# Altium footprint library WR-TBL_Spring Clamp.PcbLib: 258 footprints (part 5 of 17)
Each footprint in its own frame and in the unit in brackets; x right, y up, seen from the top. Pads: shape width x height; smd on the part's side, far side on the other; paste and mask are expansions set on the pad; w line width, h text height; cw(c..) or ccw(c..) is an arc to the next point about the centre after c.
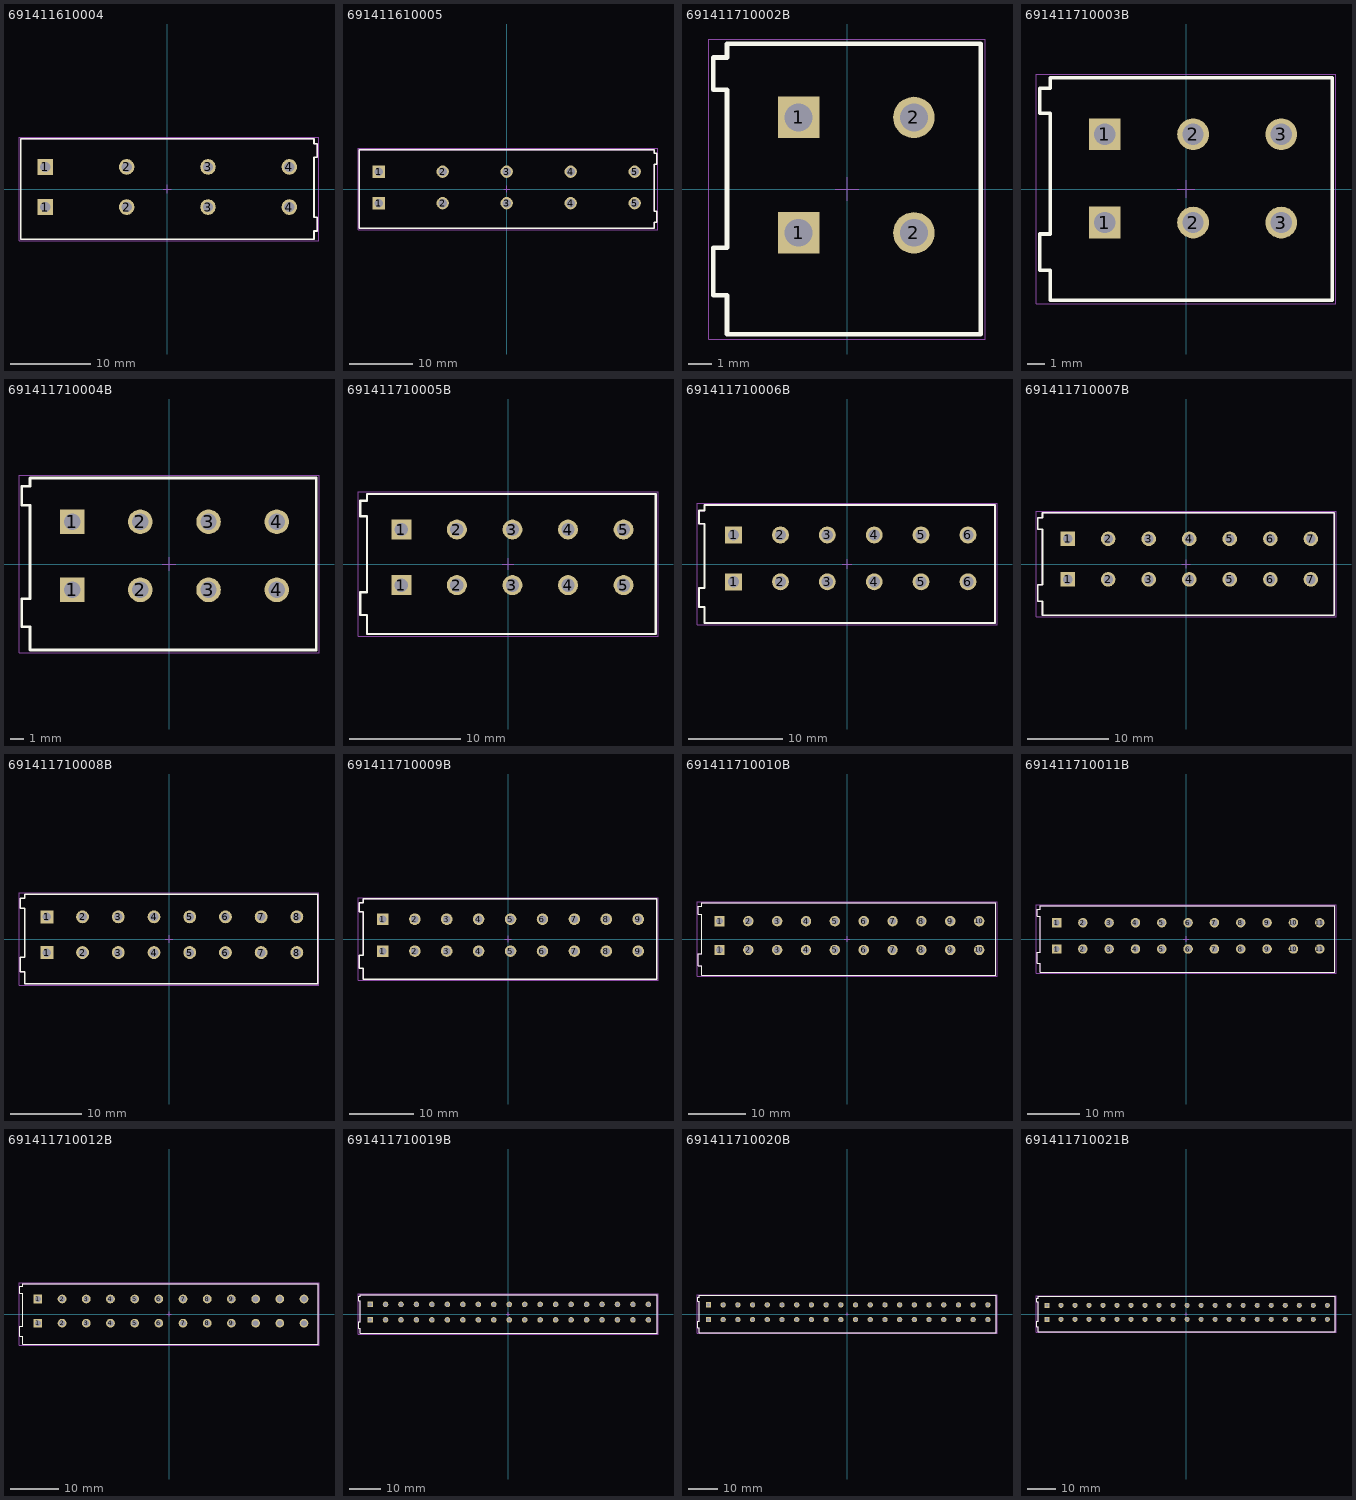
[diagram p4: the footprints below, top view; thin cyan lines are the x and y axes]

## 691411610004 [mm] "10.16mm Horizontal Cable Entry Screwless, 04p"
height 13.9
pads (8):
  rect 1.95x1.95 hole 1.3: 1(-15.24,-2.25) 1(-15.24,2.75)
  round 1.95 hole 1.3: 2(-5.08,-2.25) 2(-5.08,2.75) 3(5.08,-2.25) 3(5.08,2.75) 4(15.24,-2.25) 4(15.24,2.75)
Top Overlay:
  lines w0.2: -18.32,-6.25 -18.32,6.25 18.32,6.25 18.32,5.65 18.74,5.65 18.74,3.95 18.32,3.95 18.32,-3.55 18.74,-3.55 18.74,-5.25 18.32,-5.25 18.32,-6.25 -18.32,-6.25
Mechanical 13:
  lines w0.1: -18.32,-6.25 18.32,-6.25 18.32,-5.25 18.74,-5.25 18.74,-3.55 18.32,-3.55 18.32,3.95 18.74,3.95 18.74,5.65 18.32,5.65 18.32,6.25 -18.32,6.25 -18.32,-6.25
Mechanical 15:
  lines w0.05: -0.5,0 0.5,0 ; 0,-0.5 0,0.5 ; -18.52,-6.45 18.94,-6.45 18.94,6.45 -18.52,6.45 -18.52,-6.45
3D body "691411610004.stp": height 14, standoff -3.5, extent -18.32,-6.25 18.576,6.25

## 691411610005 [mm] "10.16mm Horizontal Cable Entry Screwless, 05p"
height 13.9
pads (10):
  rect 1.95x1.95 hole 1.3: 1(-20.32,-2.25) 1(-20.32,2.75)
  round 1.95 hole 1.3: 2(-10.16,-2.25) 2(-10.16,2.75) 3(0,-2.25) 3(0,2.75) 4(10.16,-2.25) 4(10.16,2.75) 5(20.32,-2.25) 5(20.32,2.75)
Top Overlay:
  lines w0.2: -23.4,-6.25 23.4,-6.25 23.4,-5.25 23.82,-5.25 23.82,-3.55 23.4,-3.55 23.4,3.95 23.82,3.95 23.82,5.65 23.4,5.65 23.4,6.25 -23.4,6.25 -23.4,-6.25
Mechanical 13:
  lines w0.1: -23.4,-6.25 -23.4,6.25 23.4,6.25 23.4,5.65 23.82,5.65 23.82,3.95 23.4,3.95 23.4,-3.55 23.82,-3.55 23.82,-5.25 23.4,-5.25 23.4,-6.25 -23.4,-6.25
Mechanical 15:
  lines w0.05: -0.5,0 0.5,0 ; 0,-0.5 0,0.5 ; -23.6,-6.45 -23.6,6.45 24.02,6.45 24.02,-6.45 -23.6,-6.45
3D body "691411610005 (rev1).stp": height 14, standoff -3.5, extent -23.4,-6.25 23.575,6.25

## 691411710002B [mm] "5.00 mm Screwless Horizontal Entry - 2.0 mm2 Wires, 2p"
height 15.25
pads (4):
  rect 1.8x1.8 hole 1.2: 1(-2.1,-1.9) 1(-2.1,3.1)
  round 1.8 hole 1.2: 2(2.9,-1.9) 2(2.9,3.1)
Top Overlay:
  lines w0.2: -5.8,-4.6 -5.8,-2.55 -5.2,-2.55 -5.2,4.3 -5.8,4.3 -5.8,5.7 -5.2,5.7 -5.2,6.3 5.8,6.3 5.8,-6.3 -5.2,-6.3 -5.2,-4.6 -5.8,-4.6
Mechanical 13:
  lines w0.1: -5.8,-4.6 -5.2,-4.6 -5.2,-6.3 5.8,-6.3 5.8,6.3 -5.2,6.3 -5.2,5.7 -5.8,5.7 -5.8,4.3 -5.2,4.3 -5.2,-2.55 -5.8,-2.55 -5.8,-4.6
Mechanical 15:
  lines w0.05: -0.5,0 0.5,0 ; 0,-0.5 0,0.5 ; -6,-6.5 -6,6.5 6,6.5 6,-6.5 -6,-6.5
3D body "691411710002B.stp": height 15.65, standoff -3.55, extent -5.8,-6.3 5.8,6.3

## 691411710003B [mm] "5.00 mm Screwless Horizontal Entry - 2.0 mm2 Wires, 3p"
height 15.25
pads (6):
  rect 1.8x1.8 hole 1.2: 1(-4.6,-1.9) 1(-4.6,3.1)
  round 1.8 hole 1.2: 2(0.4,-1.9) 2(0.4,3.1) 3(5.4,-1.9) 3(5.4,3.1)
Top Overlay:
  lines w0.2: -8.3,-4.6 -7.7,-4.6 -7.7,-6.3 8.3,-6.3 8.3,6.3 -7.7,6.3 -7.7,5.7 -8.3,5.7 -8.3,4.3 -7.7,4.3 -7.7,-2.55 -8.3,-2.55 -8.3,-4.6
Mechanical 13:
  lines w0.1: -8.3,-4.6 -8.3,-2.55 -7.7,-2.55 -7.7,4.3 -8.3,4.3 -8.3,5.7 -7.7,5.7 -7.7,6.3 8.3,6.3 8.3,-6.3 -7.7,-6.3 -7.7,-4.6 -8.3,-4.6
Mechanical 15:
  lines w0.05: -0.5,0 0.5,0 ; 0,-0.5 0,0.5 ; -8.5,-6.5 8.5,-6.5 8.5,6.5 -8.5,6.5 -8.5,-6.5
3D body "691411710003B.stp": height 15.65, standoff -3.55, extent -8.3,-6.3 8.3,6.3

## 691411710004B [mm] "5.00 mm Screwless Horizontal Entry - 2.0 mm2 Wires, 4p"
height 15.25
pads (8):
  rect 1.8x1.8 hole 1.2: 1(-7.1,-1.9) 1(-7.1,3.1)
  round 1.8 hole 1.2: 2(-2.1,-1.9) 2(-2.1,3.1) 3(2.9,-1.9) 3(2.9,3.1) 4(7.9,-1.9) 4(7.9,3.1)
Top Overlay:
  lines w0.2: -10.8,-4.6 -10.8,-2.55 -10.2,-2.55 -10.2,4.3 -10.8,4.3 -10.8,5.7 -10.2,5.7 -10.2,6.3 10.8,6.3 10.8,-6.3 -10.2,-6.3 -10.2,-4.6 -10.8,-4.6
Mechanical 13:
  lines w0.1: -10.8,-4.6 -10.2,-4.6 -10.2,-6.3 10.8,-6.3 10.8,6.3 -10.2,6.3 -10.2,5.7 -10.8,5.7 -10.8,4.3 -10.2,4.3 -10.2,-2.55 -10.8,-2.55 -10.8,-4.6
Mechanical 15:
  lines w0.05: -0.5,0 0.5,0 ; 0,-0.5 0,0.5 ; -11,-6.5 -11,6.5 11,6.5 11,-6.5 -11,-6.5
3D body "691411710004B.stp": height 15.65, standoff -3.55, extent -10.8,-6.3 10.8,6.3

## 691411710005B [mm] "5.00 mm Screwless Horizontal Entry - 2.0 mm2 Wires, 5p"
height 15.25
pads (10):
  rect 1.8x1.8 hole 1.2: 1(-9.6,-1.9) 1(-9.6,3.1)
  round 1.8 hole 1.2: 2(-4.6,-1.9) 2(-4.6,3.1) 3(0.4,-1.9) 3(0.4,3.1) 4(5.4,-1.9) 4(5.4,3.1) 5(10.4,-1.9) 5(10.4,3.1)
Top Overlay:
  lines w0.2: -13.3,-4.6 -13.3,-2.55 -12.7,-2.55 -12.7,4.3 -13.3,4.3 -13.3,5.7 -12.7,5.7 -12.7,6.3 13.3,6.3 13.3,-6.3 -12.7,-6.3 -12.7,-4.6 -13.3,-4.6
Mechanical 13:
  lines w0.1: -13.3,-4.6 -12.7,-4.6 -12.7,-6.3 13.3,-6.3 13.3,6.3 -12.7,6.3 -12.7,5.7 -13.3,5.7 -13.3,4.3 -12.7,4.3 -12.7,-2.55 -13.3,-2.55 -13.3,-4.6
Mechanical 15:
  lines w0.05: -0.5,0 0.5,0 ; 0,-0.5 0,0.5 ; -13.5,-6.5 -13.5,6.5 13.5,6.5 13.5,-6.5 -13.5,-6.5
3D body "691411710005B.stp": height 15.65, standoff -3.55, extent -13.3,-6.3 13.3,6.3

## 691411710006B [mm] "5.00 mm Screwless Horizontal Entry - 2.0 mm2 Wires, 6p"
height 15.25
pads (12):
  rect 1.8x1.8 hole 1.2: 1(-12.1,-1.9) 1(-12.1,3.1)
  round 1.8 hole 1.2: 2(-7.1,-1.9) 2(-7.1,3.1) 3(-2.1,-1.9) 3(-2.1,3.1) 4(2.9,-1.9) 4(2.9,3.1) 5(7.9,-1.9) 5(7.9,3.1) 6(12.9,-1.9) 6(12.9,3.1)
Top Overlay:
  lines w0.2: -15.8,-4.6 -15.2,-4.6 -15.2,-6.3 15.8,-6.3 15.8,6.3 -15.2,6.3 -15.2,5.7 -15.8,5.7 -15.8,4.3 -15.2,4.3 -15.2,-2.55 -15.8,-2.55 -15.8,-4.6
Mechanical 13:
  lines w0.1: -15.8,-4.6 -15.8,-2.55 -15.2,-2.55 -15.2,4.3 -15.8,4.3 -15.8,5.7 -15.2,5.7 -15.2,6.3 15.8,6.3 15.8,-6.3 -15.2,-6.3 -15.2,-4.6 -15.8,-4.6
Mechanical 15:
  lines w0.05: -0.5,0 0.5,0 ; 0,-0.5 0,0.5 ; -16,-6.5 16,-6.5 16,6.5 -16,6.5 -16,-6.5
3D body "691411710006B.stp": height 15.65, standoff -3.55, extent -15.8,-6.3 15.8,6.3

## 691411710007B [mm] "5.00 mm Screwless Horizontal Entry - 2.0 mm2 Wires, 7p"
height 15.25
pads (14):
  rect 1.8x1.8 hole 1.2: 1(-14.6,-1.9) 1(-14.6,3.1)
  round 1.8 hole 1.2: 2(-9.6,-1.9) 2(-9.6,3.1) 3(-4.6,-1.9) 3(-4.6,3.1) 4(0.4,-1.9) 4(0.4,3.1) 5(5.4,-1.9) 5(5.4,3.1) 6(10.4,-1.9) 6(10.4,3.1) 7(15.4,-1.9) 7(15.4,3.1)
Top Overlay:
  lines w0.2: -18.3,-4.6 -18.3,-2.55 -17.7,-2.55 -17.7,4.3 -18.3,4.3 -18.3,5.7 -17.7,5.7 -17.7,6.3 18.3,6.3 18.3,-6.3 -17.7,-6.3 -17.7,-4.6 -18.3,-4.6
Mechanical 13:
  lines w0.1: -18.3,-4.6 -17.7,-4.6 -17.7,-6.3 18.3,-6.3 18.3,6.3 -17.7,6.3 -17.7,5.7 -18.3,5.7 -18.3,4.3 -17.7,4.3 -17.7,-2.55 -18.3,-2.55 -18.3,-4.6
Mechanical 15:
  lines w0.05: -0.5,0 0.5,0 ; 0,-0.5 0,0.5 ; -18.5,-6.5 -18.5,6.5 18.5,6.5 18.5,-6.5 -18.5,-6.5
3D body "691411710007B.stp": height 15.65, standoff -3.55, extent -18.3,-6.3 18.3,6.3

## 691411710008B [mm] "5.00 mm Screwless Horizontal Entry - 2.0 mm2 Wires, 8p"
height 15.25
pads (16):
  rect 1.8x1.8 hole 1.2: 1(-17.1,-1.9) 1(-17.1,3.1)
  round 1.8 hole 1.2: 2(-12.1,-1.9) 2(-12.1,3.1) 3(-7.1,-1.9) 3(-7.1,3.1) 4(-2.1,-1.9) 4(-2.1,3.1) 5(2.9,-1.9) 5(2.9,3.1) 6(7.9,-1.9) 6(7.9,3.1) 7(12.9,-1.9) 7(12.9,3.1) 8(17.9,-1.9) 8(17.9,3.1)
Top Overlay:
  lines w0.2: -20.8,-4.6 -20.2,-4.6 -20.2,-6.3 20.8,-6.3 20.8,6.3 -20.2,6.3 -20.2,5.7 -20.8,5.7 -20.8,4.3 -20.2,4.3 -20.2,-2.55 -20.8,-2.55 -20.8,-4.6
Mechanical 13:
  lines w0.1: -20.8,-4.6 -20.8,-2.55 -20.2,-2.55 -20.2,4.3 -20.8,4.3 -20.8,5.7 -20.2,5.7 -20.2,6.3 20.8,6.3 20.8,-6.3 -20.2,-6.3 -20.2,-4.6 -20.8,-4.6
Mechanical 15:
  lines w0.05: -0.5,0 0.5,0 ; 0,-0.5 0,0.5 ; -21,-6.5 21,-6.5 21,6.5 -21,6.5 -21,-6.5
3D body "691411710008B.stp": height 15.65, standoff -3.55, extent -20.8,-6.3 20.8,6.3

## 691411710009B [mm] "5.00 mm Screwless Horizontal Entry - 2.0 mm2 Wires, 9p"
height 15.25
pads (18):
  rect 1.8x1.8 hole 1.2: 1(-19.6,-1.9) 1(-19.6,3.1)
  round 1.8 hole 1.2: 2(-14.6,-1.9) 2(-14.6,3.1) 3(-9.6,-1.9) 3(-9.6,3.1) 4(-4.6,-1.9) 4(-4.6,3.1) 5(0.4,-1.9) 5(0.4,3.1) 6(5.4,-1.9) 6(5.4,3.1) 7(10.4,-1.9) 7(10.4,3.1) 8(15.4,-1.9) 8(15.4,3.1) 9(20.4,-1.9) 9(20.4,3.1)
Top Overlay:
  lines w0.2: -23.3,-4.6 -22.7,-4.6 -22.7,-6.3 23.3,-6.3 23.3,6.3 -22.7,6.3 -22.7,5.7 -23.3,5.7 -23.3,4.3 -22.7,4.3 -22.7,-2.55 -23.3,-2.55 -23.3,-4.6
Mechanical 13:
  lines w0.1: -23.3,-4.6 -23.3,-2.55 -22.7,-2.55 -22.7,4.3 -23.3,4.3 -23.3,5.7 -22.7,5.7 -22.7,6.3 23.3,6.3 23.3,-6.3 -22.7,-6.3 -22.7,-4.6 -23.3,-4.6
Mechanical 15:
  lines w0.05: -0.5,0 0.5,0 ; 0,-0.5 0,0.5 ; -23.5,-6.5 23.5,-6.5 23.5,6.5 -23.5,6.5 -23.5,-6.5
3D body "691411710009B.stp": height 15.65, standoff -3.55, extent -23.3,-6.3 23.3,6.3

## 691411710010B [mm] "5.00 mm Screwless Horizontal Entry - 2.0 mm2 Wires, 10p"
height 15.25
pads (20):
  rect 1.8x1.8 hole 1.2: 1(-22.1,-1.9) 1(-22.1,3.1)
  round 1.8 hole 1.2: 2(-17.1,-1.9) 2(-17.1,3.1) 3(-12.1,-1.9) 3(-12.1,3.1) 4(-7.1,-1.9) 4(-7.1,3.1) 5(-2.1,-1.9) 5(-2.1,3.1) 6(2.9,-1.9) 6(2.9,3.1) 7(7.9,-1.9) 7(7.9,3.1) 8(12.9,-1.9) 8(12.9,3.1) 9(17.9,-1.9) 9(17.9,3.1) 10(22.9,-1.9) 10(22.9,3.1)
Top Overlay:
  lines w0.2: -25.8,-4.6 -25.8,-2.55 -25.2,-2.55 -25.2,4.3 -25.8,4.3 -25.8,5.7 -25.2,5.7 -25.2,6.3 25.8,6.3 25.8,-6.3 -25.2,-6.3 -25.2,-4.6 -25.8,-4.6
Mechanical 13:
  lines w0.1: -25.8,-4.6 -25.2,-4.6 -25.2,-6.3 25.8,-6.3 25.8,6.3 -25.2,6.3 -25.2,5.7 -25.8,5.7 -25.8,4.3 -25.2,4.3 -25.2,-2.55 -25.8,-2.55 -25.8,-4.6
Mechanical 15:
  lines w0.05: -0.5,0 0.5,0 ; 0,-0.5 0,0.5 ; -26,-6.5 -26,6.5 26,6.5 26,-6.5 -26,-6.5
3D body "691411710010B.stp": height 15.65, standoff -3.55, extent -25.8,-6.3 25.8,6.3

## 691411710011B [mm] "5.00 mm Screwless Horizontal Entry - 2.0 mm2 Wires, 11p"
height 15.25
pads (22):
  rect 1.8x1.8 hole 1.2: 1(-24.6,-1.9) 1(-24.6,3.1)
  round 1.8 hole 1.2: 2(-19.6,-1.9) 2(-19.6,3.1) 3(-14.6,-1.9) 3(-14.6,3.1) 4(-9.6,-1.9) 4(-9.6,3.1) 5(-4.6,-1.9) 5(-4.6,3.1) 6(0.4,-1.9) 6(0.4,3.1) 7(5.4,-1.9) 7(5.4,3.1) 8(10.4,-1.9) 8(10.4,3.1) 9(15.4,-1.9) 9(15.4,3.1) 10(20.4,-1.9) 10(20.4,3.1) 11(25.4,-1.9) 11(25.4,3.1)
Top Overlay:
  lines w0.2: -28.3,-4.6 -27.7,-4.6 -27.7,-6.3 28.3,-6.3 28.3,6.3 -27.7,6.3 -27.7,5.7 -28.3,5.7 -28.3,4.3 -27.7,4.3 -27.7,-2.55 -28.3,-2.55 -28.3,-4.6
Mechanical 13:
  lines w0.1: -28.3,-4.6 -28.3,-2.55 -27.7,-2.55 -27.7,4.3 -28.3,4.3 -28.3,5.7 -27.7,5.7 -27.7,6.3 28.3,6.3 28.3,-6.3 -27.7,-6.3 -27.7,-4.6 -28.3,-4.6
Mechanical 15:
  lines w0.05: -0.5,0 0.5,0 ; 0,-0.5 0,0.5 ; -28.5,-6.5 28.5,-6.5 28.5,6.5 -28.5,6.5 -28.5,-6.5
3D body "691411710011B.stp": height 15.65, standoff -3.55, extent -28.3,-6.3 28.3,6.3

## 691411710012B [mm] "5.00 mm Screwless Horizontal Entry - 2.0 mm2 Wires, 12p"
height 15.25
pads (24):
  rect 1.8x1.8 hole 1.2: 1(-27.1,-1.9) 1(-27.1,3.1)
  round 1.8 hole 1.2: 2(-22.1,-1.9) 2(-22.1,3.1) 3(-17.1,-1.9) 3(-17.1,3.1) 4(-12.1,-1.9) 4(-12.1,3.1) 5(-7.1,-1.9) 5(-7.1,3.1) 6(-2.1,-1.9) 6(-2.1,3.1) 7(2.9,-1.9) 7(2.9,3.1) 8(7.9,-1.9) 8(7.9,3.1) 9(12.9,-1.9) 9(12.9,3.1) 10(17.9,-1.9) 10(17.9,3.1) 11(22.9,-1.9) 11(22.9,3.1) 12(27.9,-1.9) 12(27.9,3.1)
Top Overlay:
  lines w0.2: -30.8,-4.6 -30.8,-2.55 -30.2,-2.55 -30.2,4.3 -30.8,4.3 -30.8,5.7 -30.2,5.7 -30.2,6.3 30.8,6.3 30.8,-6.3 -30.2,-6.3 -30.2,-4.6 -30.8,-4.6
Mechanical 13:
  lines w0.1: -30.8,-4.6 -30.2,-4.6 -30.2,-6.3 30.8,-6.3 30.8,6.3 -30.2,6.3 -30.2,5.7 -30.8,5.7 -30.8,4.3 -30.2,4.3 -30.2,-2.55 -30.8,-2.55 -30.8,-4.6
Mechanical 15:
  lines w0.05: -0.5,0 0.5,0 ; 0,-0.5 0,0.5 ; -31,-6.5 -31,6.5 31,6.5 31,-6.5 -31,-6.5
3D body "691411710012B.stp": height 15.65, standoff -3.55, extent -30.8,-6.3 30.8,6.3

## 691411710019B [mm] "5.00 mm Screwless Horizontal Entry - 2.0 mm2 Wires, 19p"
height 15.25
pads (38):
  rect 1.8x1.8 hole 1.2: 1(-44.6,-1.9) 1(-44.6,3.1)
  round 1.8 hole 1.2: 2(-39.6,-1.9) 2(-39.6,3.1) 3(-34.6,-1.9) 3(-34.6,3.1) 4(-29.6,-1.9) 4(-29.6,3.1) 5(-24.6,-1.9) 5(-24.6,3.1) 6(-19.6,-1.9) 6(-19.6,3.1) 7(-14.6,-1.9) 7(-14.6,3.1) 8(-9.6,-1.9) 8(-9.6,3.1) 9(-4.6,-1.9) 9(-4.6,3.1) 10(0.4,-1.9) 10(0.4,3.1) 11(5.4,-1.9) 11(5.4,3.1) 12(10.4,-1.9) 12(10.4,3.1) 13(15.4,-1.9) 13(15.4,3.1) 14(20.4,-1.9) 14(20.4,3.1) 15(25.4,-1.9) 15(25.4,3.1) 16(30.4,-1.9) 16(30.4,3.1) 17(35.4,-1.9) 17(35.4,3.1) 18(40.4,-1.9) 18(40.4,3.1) 19(45.4,-1.9) 19(45.4,3.1)
Top Overlay:
  lines w0.2: -48.3,-4.6 -47.7,-4.6 -47.7,-6.3 48.3,-6.3 48.3,6.3 -47.7,6.3 -47.7,5.7 -48.3,5.7 -48.3,4.3 -47.7,4.3 -47.7,-2.55 -48.3,-2.55 -48.3,-4.6
Mechanical 13:
  lines w0.1: -48.3,-4.6 -48.3,-2.55 -47.7,-2.55 -47.7,4.3 -48.3,4.3 -48.3,5.7 -47.7,5.7 -47.7,6.3 48.3,6.3 48.3,-6.3 -47.7,-6.3 -47.7,-4.6 -48.3,-4.6
Mechanical 15:
  lines w0.05: -0.5,0 0.5,0 ; 0,-0.5 0,0.5 ; -48.5,-6.5 48.5,-6.5 48.5,6.5 -48.5,6.5 -48.5,-6.5
3D body "691411710019B.stp": height 15.65, standoff -3.55, extent -48.3,-6.3 48.3,6.3

## 691411710020B [mm] "5.00 mm Screwless Horizontal Entry - 2.0 mm2 Wires, 20p"
height 15.25
pads (40):
  rect 1.8x1.8 hole 1.2: 1(-47.1,-1.9) 1(-47.1,3.1)
  round 1.8 hole 1.2: 2(-42.1,-1.9) 2(-42.1,3.1) 3(-37.1,-1.9) 3(-37.1,3.1) 4(-32.1,-1.9) 4(-32.1,3.1) 5(-27.1,-1.9) 5(-27.1,3.1) 6(-22.1,-1.9) 6(-22.1,3.1) 7(-17.1,-1.9) 7(-17.1,3.1) 8(-12.1,-1.9) 8(-12.1,3.1) 9(-7.1,-1.9) 9(-7.1,3.1) 10(-2.1,-1.9) 10(-2.1,3.1) 11(2.9,-1.9) 11(2.9,3.1) 12(7.9,-1.9) 12(7.9,3.1) 13(12.9,-1.9) 13(12.9,3.1) 14(17.9,-1.9) 14(17.9,3.1) 15(22.9,-1.9) 15(22.9,3.1) 16(27.9,-1.9) 16(27.9,3.1) 17(32.9,-1.9) 17(32.9,3.1) 18(37.9,-1.9) 18(37.9,3.1) 19(42.9,-1.9) 19(42.9,3.1) 20(47.9,-1.9) 20(47.9,3.1)
Top Overlay:
  lines w0.2: -50.8,-4.6 -50.8,-2.55 -50.2,-2.55 -50.2,4.3 -50.8,4.3 -50.8,5.7 -50.2,5.7 -50.2,6.3 50.8,6.3 50.8,-6.3 -50.2,-6.3 -50.2,-4.6 -50.8,-4.6
Mechanical 13:
  lines w0.1: -50.8,-4.6 -50.2,-4.6 -50.2,-6.3 50.8,-6.3 50.8,6.3 -50.2,6.3 -50.2,5.7 -50.8,5.7 -50.8,4.3 -50.2,4.3 -50.2,-2.55 -50.8,-2.55 -50.8,-4.6
Mechanical 15:
  lines w0.05: -0.5,0 0.5,0 ; 0,-0.5 0,0.5 ; -51,-6.5 -51,6.5 51,6.5 51,-6.5 -51,-6.5
3D body "691411710020B.stp": height 15.65, standoff -3.55, extent -50.8,-6.3 50.8,6.3

## 691411710021B [mm] "5.00 mm Screwless Horizontal Entry - 2.0 mm2 Wires, 21p"
height 15.25
pads (42):
  rect 1.8x1.8 hole 1.2: 1(-49.6,-1.9) 1(-49.6,3.1)
  round 1.8 hole 1.2: 2(-44.6,-1.9) 2(-44.6,3.1) 3(-39.6,-1.9) 3(-39.6,3.1) 4(-34.6,-1.9) 4(-34.6,3.1) 5(-29.6,-1.9) 5(-29.6,3.1) 6(-24.6,-1.9) 6(-24.6,3.1) 7(-19.6,-1.9) 7(-19.6,3.1) 8(-14.6,-1.9) 8(-14.6,3.1) 9(-9.6,-1.9) 9(-9.6,3.1) 10(-4.6,-1.9) 10(-4.6,3.1) 11(0.4,-1.9) 11(0.4,3.1) 12(5.4,-1.9) 12(5.4,3.1) 13(10.4,-1.9) 13(10.4,3.1) 14(15.4,-1.9) 14(15.4,3.1) 15(20.4,-1.9) 15(20.4,3.1) 16(25.4,-1.9) 16(25.4,3.1) 17(30.4,-1.9) 17(30.4,3.1) 18(35.4,-1.9) 18(35.4,3.1) 19(40.4,-1.9) 19(40.4,3.1) 20(45.4,-1.9) 20(45.4,3.1) 21(50.4,-1.9) 21(50.4,3.1)
Top Overlay:
  lines w0.2: -53.3,-4.6 -52.7,-4.6 -52.7,-6.3 53.3,-6.3 53.3,6.3 -52.7,6.3 -52.7,5.7 -53.3,5.7 -53.3,4.3 -52.7,4.3 -52.7,-2.55 -53.3,-2.55 -53.3,-4.6
Mechanical 13:
  lines w0.1: -53.3,-4.6 -53.3,-2.55 -52.7,-2.55 -52.7,4.3 -53.3,4.3 -53.3,5.7 -52.7,5.7 -52.7,6.3 53.3,6.3 53.3,-6.3 -52.7,-6.3 -52.7,-4.6 -53.3,-4.6
Mechanical 15:
  lines w0.05: -0.5,0 0.5,0 ; 0,-0.5 0,0.5 ; -53.5,-6.5 53.5,-6.5 53.5,6.5 -53.5,6.5 -53.5,-6.5
3D body "691411710021B.stp": height 15.65, standoff -3.55, extent -53.3,-6.3 53.3,6.3